# Altium footprint library Basal.PcbLib: 248 footprints (part 9 of 16)
Each footprint in its own frame and in the unit in brackets; x right, y up, seen from the top. Pads: shape width x height; smd on the part's side, far side on the other; paste and mask are expansions set on the pad; w line width, h text height; cw(c..) or ccw(c..) is an arc to the next point about the centre after c.
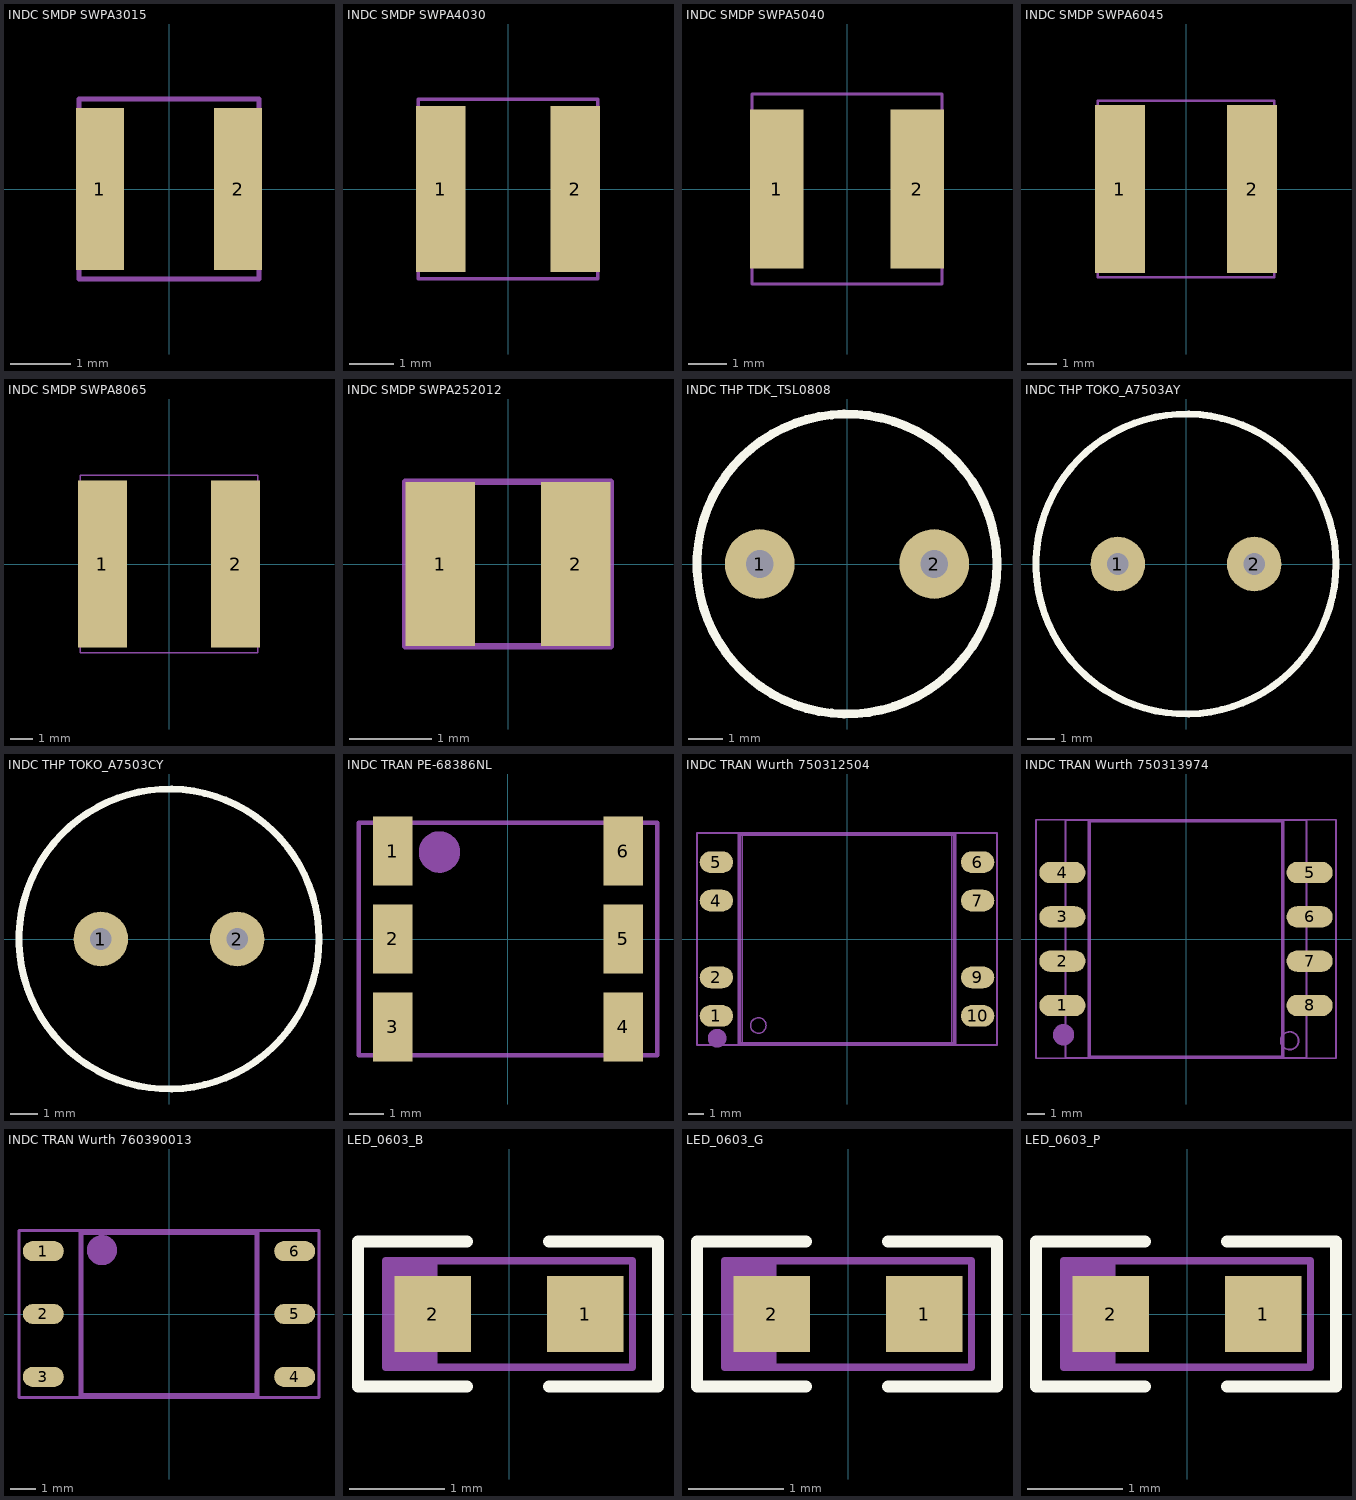
[diagram p8: the footprints below, top view; thin cyan lines are the x and y axes]

## INDC SMDP SWPA3015 [mm] "TDK贴片功率电感"
pads (2):
  rect 0.8x2.7 smd: 1(-1.15,0) 2(1.15,0)
Mechanical 15:
  lines w0.076: -1.5,-1.5 1.5,-1.5 1.5,1.5 -1.5,1.5 -1.5,-1.5
3D body "TAIYO NR 3015.STEP": height 1.48, standoff -0.02, extent -1.5,-1.5 1.5,1.5

## INDC SMDP SWPA4030 [mm] "TDK贴片功率电感"
pads (2):
  rect 1.1x3.7 smd: 1(-1.5,0) 2(1.5,0)
Mechanical 15:
  lines w0.076: -2,-2 2,-2 2,2 -2,2 -2,-2
3D body "Coilcraft LPS4018.STEP": height 3, standoff 1.2, extent -1.99,-1.99 1.99,1.99
3D body "Coilcraft LPS4018.STEP": height 1.8, standoff 0, extent -1.99,-1.99 1.99,1.99

## INDC SMDP SWPA5040 [mm] "TDK贴片功率电感"
pads (2):
  rect 1.4x4.2 smd: 1(-1.85,0) 2(1.85,0)
Mechanical 15:
  lines w0.076: -2.5,-2.5 -2.5,2.5 2.5,2.5 2.5,-2.5 -2.5,-2.5
3D body: height 4, standoff 0, extent -2.502,-2.502 2.502,2.502

## INDC SMDP SWPA6045 [mm] "TDK贴片功率电感"
pads (2):
  rect 1.7x5.7 smd: 1(-2.25,0) 2(2.25,0)
Mechanical 15:
  lines w0.076: -3,-3 3,-3 3,3 -3,3 -3,-3
3D body "TAIYO NR 6028.STEP": height 2.81, standoff -0.05, extent -3,-3 3,3

## INDC SMDP SWPA8065 [mm] "TDK贴片功率电感"
pads (2):
  rect 2.2x7.5 smd: 1(-3,0) 2(3,0)
Mechanical 15:
  lines w0.076: -4,-4 -4,4 4,4 4,-4 -4,-4
3D body: height 6.5, standoff 0, extent -4,-4 4,4

## INDC SMDP SWPA252012 [mm] "TDK贴片功率电感"
pads (2):
  rect 0.85x2 smd: 1(-0.825,0) 2(0.825,0)
Mechanical 15:
  lines w0.076: -1.25,-1 1.25,-1 1.25,1 -1.25,1 -1.25,-1
3D body: height 1.3, standoff 0.1, extent -1.25,-1 1.25,1

## INDC THP TDK_TSL0808 [mm]
pads (2):
  round 2 hole 0.8: 1(-2.5,0) 2(2.5,0)
Top Overlay:
  circle w0.254: c0,0 r4.3
3D body: height 8.3, standoff 0, extent -4.3,-4.299 4.3,4.299

## INDC THP TOKO_A7503AY [mm]
pads (2):
  round 2 hole 0.8: 1(-2.5,0) 2(2.5,0)
Top Overlay:
  circle w0.254: c0,0 r5.5
3D body: height 13.5, standoff 0, extent -5.5,-5.498 5.5,5.498
3D body: height 0.5, standoff -2.5, extent -2.81,-0.309 -2.19,0.31
3D body: height 0.5, standoff -2.5, extent 2.19,-0.309 2.81,0.31

## INDC THP TOKO_A7503CY [mm]
pads (2):
  round 2 hole 0.8: 1(-2.5,0) 2(2.5,0)
Top Overlay:
  circle w0.254: c0,0 r5.5
3D body: height 0.5, standoff -2.5, extent 2.19,-0.309 2.81,0.31
3D body: height 0.5, standoff -2.5, extent -2.81,-0.309 -2.19,0.31
3D body: height 12, standoff 0, extent -5.5,-5.498 5.5,5.499

## INDC TRAN PE-68386NL [mm] "SOP, 6-Leads, Body 7.00x7.00mm, Pitch 1.85mm, IPC Medium Density"
height 6
pads (6):
  rect 1.14x2 smd: 1(-3.337,2.54) 2(-3.337,0) 3(-3.337,-2.54) 4(3.337,-2.54) 5(3.337,0) 6(3.337,2.54)
Mechanical 15:
  circle w0.6: c-1.981,2.515 r0.3
  lines w0.127: -4.32,-3.366 4.32,-3.366 4.32,3.366 -4.32,3.366 -4.32,-3.366
3D body: height 2.49, standoff 0.13, extent -4.318,-3.365 4.318,3.366

## INDC TRAN Wurth 750312504 [mm] "SOP, 10-Leads, Body 13.46x13.46mm, Pitch 2.48mm, IPC Low Density"
height 12.7
pads (8):
  oval 2.15x1.4 smd: 1(-8.425,-4.96) 2(-8.425,-2.48) 4(-8.425,2.48) 5(-8.425,4.96) 6(8.425,4.96) 7(8.425,2.48) 9(8.425,-2.48) 10(8.425,-4.96)
Mechanical 13:
  circle w0.1: c-5.723,-5.58 r0.5
  lines w0.1: -6.75,-6.75 -6.75,6.75 6.75,6.75 6.75,-6.75 -6.75,-6.75
Mechanical 15:
  circle w0.6: c-8.382,-6.401 r0.3
  lines w0.127: -9.677,-6.833 -9.677,6.833 9.677,6.833 9.677,-6.833 -9.677,-6.833
  lines w0.2: -6.95,-6.75 -6.95,6.75 6.95,6.75 6.95,-6.75 -6.95,-6.75
3D body: height 12.7, standoff 0.1, extent -6.75,-6.75 6.75,6.75

## INDC TRAN Wurth 750313974 [mm] "SOP, 8-Leads, Body 13.3x13.6mm (max), Pitch 2.49mm, IPC Medium Density"
height 11.43
pads (8):
  oval 2.6x1.2 smd: 1(-6.95,-3.735) 2(-6.95,-1.245) 3(-6.95,1.245) 4(-6.95,3.735) 5(6.95,3.735) 6(6.95,1.245) 7(6.95,-1.245) 8(6.95,-3.735)
Mechanical 13:
  circle w0.1: c5.83,-5.72 r0.5
  lines w0.1: -6.78,-6.67 -6.78,6.67 6.78,6.67 6.78,-6.67 -6.78,-6.67
Mechanical 15:
  circle w0.6: c-6.883,-5.385 r0.3
  lines w0.1: -8.433,-6.706 -8.433,6.706 8.433,6.706 8.433,-6.706 -8.433,-6.706
  lines w0.2: -5.45,-6.65 -5.45,6.65 5.45,6.65 5.45,-6.65 -5.45,-6.65
3D body: height 11.43, standoff 0.5, extent -6.78,-6.67 6.78,6.67

## INDC TRAN Wurth 760390013 [mm] "SOP, 6-Leads, Body 7.00x7.00mm, Pitch 1.85mm, IPC Medium Density"
height 6
pads (6):
  oval 1.63x0.8 smd: 1(-5,2.5) 2(-5,0) 3(-5,-2.5) 4(5,-2.5) 5(5,0) 6(5,2.5)
Mechanical 15:
  circle w0.6: c-2.667,2.54 r0.3
  lines w0.1: -3.5,-3.25 3.5,-3.25 3.5,3.25 -3.5,3.25 -3.5,-3.25
  lines w0.127: -5.969,-3.327 5.969,-3.327 5.969,3.327 -5.969,3.327 -5.969,-3.327
  lines w0.2: -3.5,-3.25 3.5,-3.25 3.5,3.25 -3.5,3.25 -3.5,-3.25
3D body: height 4, standoff 0.5, extent -3.5,-3.25 3.5,3.25

## LED_0603_B [mm] "蓝色贴片0603LED"
pads (2):
  rect 0.8x0.8 smd paste-1: 1(0.8,0) 2(-0.8,0)
Top Overlay:
  lines w0.127: -0.443,-0.762 -1.586,-0.762 -1.586,0.762 -0.443,0.762 ; 0.421,-0.762 1.564,-0.762 1.564,0.762 0.421,0.762
Top Paste:
  region: 0.419,0.15 0.719,0.368 1.169,0.368 1.169,-0.368 0.719,-0.368 0.419,-0.15
  region: -0.419,-0.15 -0.719,-0.368 -1.169,-0.368 -1.169,0.368 -0.719,0.368 -0.419,0.15
Mechanical 15:
  lines w0.076: -1.245,-0.559 -1.245,0.559 ; -1.194,-0.559 -1.194,0.559 ; -1.143,-0.559 -1.143,0.559 ; -1.092,-0.559 -1.092,0.559 ; -1.041,-0.559 -1.041,0.559 ; -0.991,-0.559 -0.991,0.559 ; -0.94,-0.559 -0.94,0.559 ; -0.889,-0.559 -0.889,0.559 ; -0.838,-0.559 -0.838,0.559 ; -0.787,-0.559 -0.787,0.559 ; -1.295,-0.559 -1.295,0.559 1.295,0.559 1.295,-0.559 -1.295,-0.559
3D body "BLUE0603.STEP": height 0.8, standoff 0, extent -0.8,-0.4 0.8,0.4

## LED_0603_G [mm] "绿色贴片0603LED"
pads (2):
  rect 0.8x0.8 smd paste-1: 1(0.8,0) 2(-0.8,0)
Top Overlay:
  lines w0.127: -0.443,-0.762 -1.586,-0.762 -1.586,0.762 -0.443,0.762 ; 0.421,-0.762 1.564,-0.762 1.564,0.762 0.421,0.762
Top Paste:
  region: 0.419,0.15 0.719,0.368 1.169,0.368 1.169,-0.368 0.719,-0.368 0.419,-0.15
  region: -0.419,-0.15 -0.719,-0.368 -1.169,-0.368 -1.169,0.368 -0.719,0.368 -0.419,0.15
Mechanical 15:
  lines w0.076: -1.245,-0.559 -1.245,0.559 ; -1.194,-0.559 -1.194,0.559 ; -1.143,-0.559 -1.143,0.559 ; -1.092,-0.559 -1.092,0.559 ; -1.041,-0.559 -1.041,0.559 ; -0.991,-0.559 -0.991,0.559 ; -0.94,-0.559 -0.94,0.559 ; -0.889,-0.559 -0.889,0.559 ; -0.838,-0.559 -0.838,0.559 ; -0.787,-0.559 -0.787,0.559 ; -1.295,-0.559 -1.295,0.559 1.295,0.559 1.295,-0.559 -1.295,-0.559
3D body "GREEN0603.STEP": height 0.8, standoff 0, extent -0.8,-0.4 0.8,0.4

## LED_0603_P [mm] "紫色贴片0603LED"
pads (2):
  rect 0.8x0.8 smd paste-1: 1(0.8,0) 2(-0.8,0)
Top Overlay:
  lines w0.127: -0.443,-0.762 -1.586,-0.762 -1.586,0.762 -0.443,0.762 ; 0.421,-0.762 1.564,-0.762 1.564,0.762 0.421,0.762
Top Paste:
  region: -0.419,-0.15 -0.719,-0.368 -1.169,-0.368 -1.169,0.368 -0.719,0.368 -0.419,0.15
  region: 0.419,0.15 0.719,0.368 1.169,0.368 1.169,-0.368 0.719,-0.368 0.419,-0.15
Mechanical 15:
  lines w0.076: -1.245,-0.559 -1.245,0.559 ; -1.194,-0.559 -1.194,0.559 ; -1.143,-0.559 -1.143,0.559 ; -1.092,-0.559 -1.092,0.559 ; -1.041,-0.559 -1.041,0.559 ; -0.991,-0.559 -0.991,0.559 ; -0.94,-0.559 -0.94,0.559 ; -0.889,-0.559 -0.889,0.559 ; -0.838,-0.559 -0.838,0.559 ; -0.787,-0.559 -0.787,0.559 ; -1.295,-0.559 1.295,-0.559 1.295,0.559 -1.295,0.559 -1.295,-0.559
3D body "PINK0603.STEP": height 0.8, standoff 0, extent -0.8,-0.4 0.8,0.4